# Altium footprint library Horizontal Shielded Modular Jack.PcbLib: 23 footprints (part 1 of 2)
Each footprint in its own frame and in the unit in brackets; x right, y up, seen from the top. Pads: shape width x height; smd on the part's side, far side on the other; paste and mask are expansions set on the pad; w line width, h text height; cw(c..) or ccw(c..) is an arc to the next point about the centre after c.
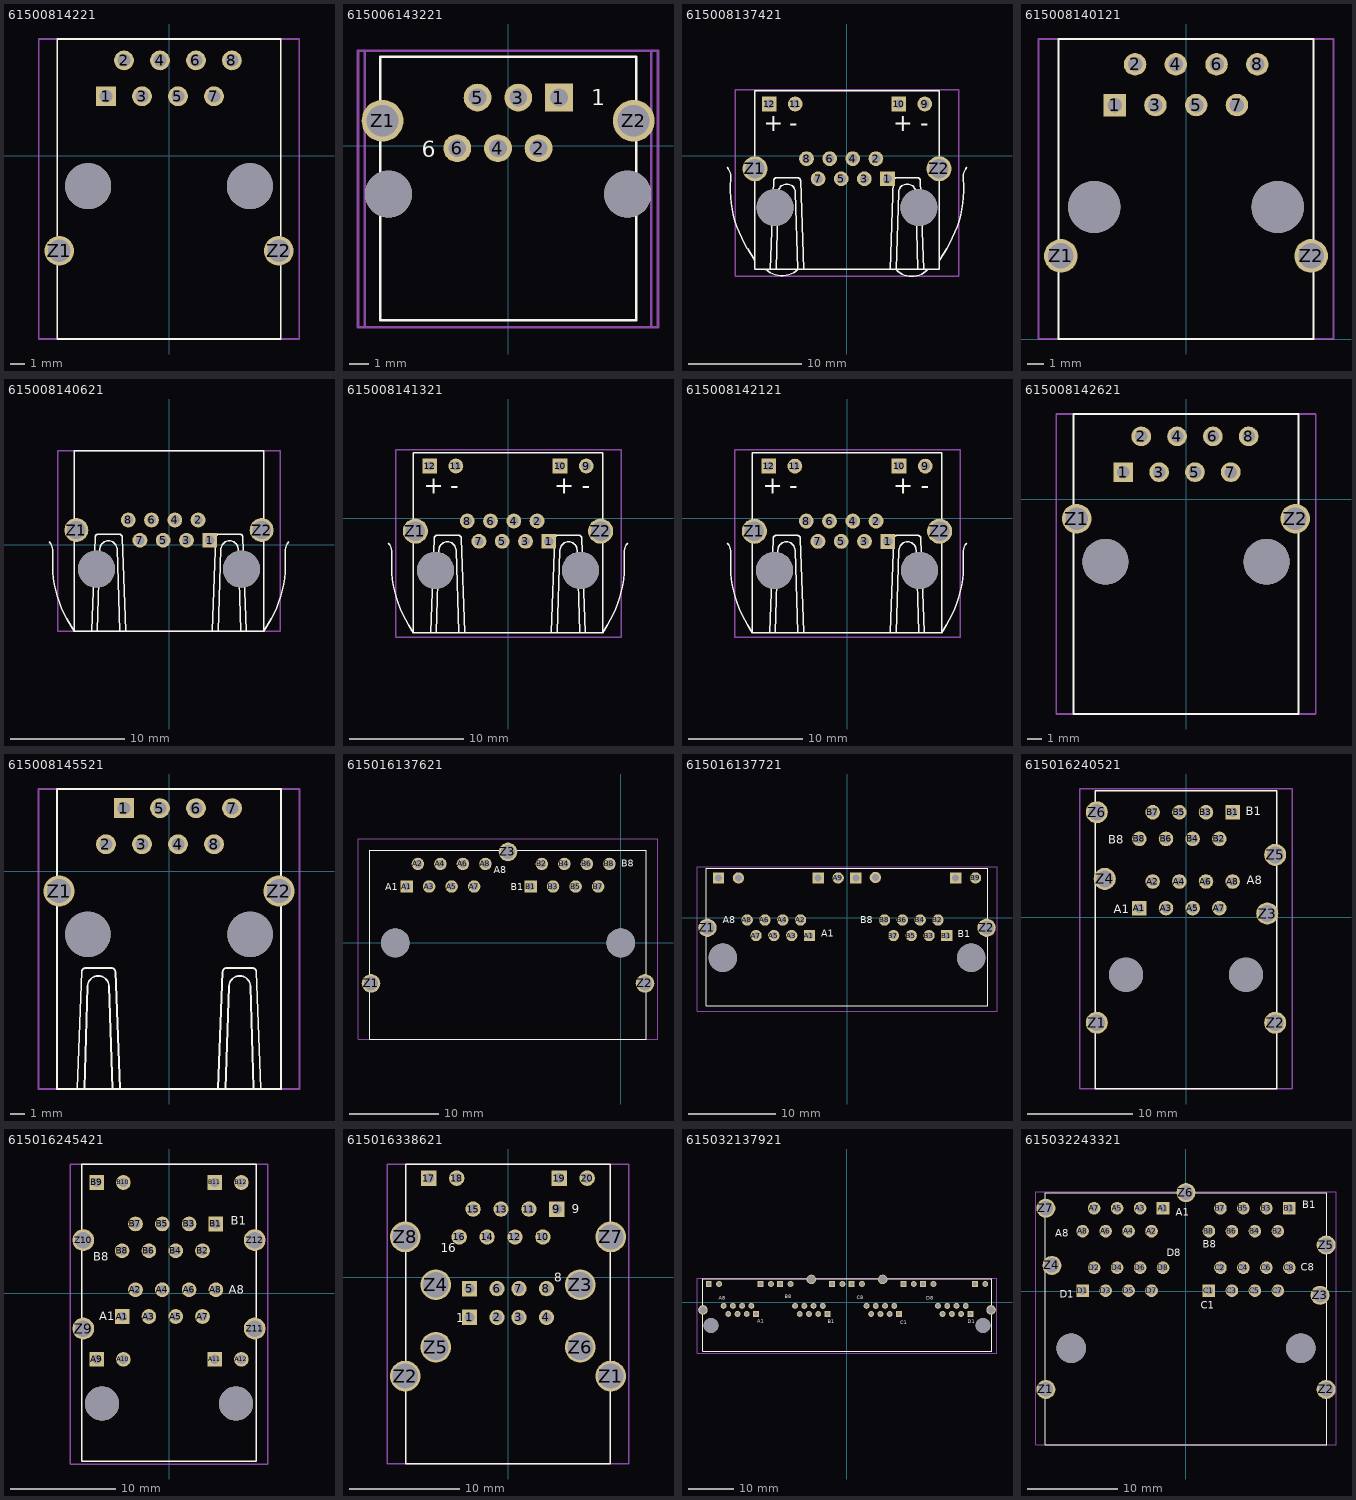
[diagram p0: the footprints below, top view; thin cyan lines are the x and y axes]

## 61500814221 [mm] "RJ45 Horizontal  Shielded  Tab down"
height 13.65
pads (12):
  rect 1.4x1.4 hole 0.9: 1(-4.445,4.19)
  round 1.4 hole 0.9: 2(-3.175,6.73) 3(-1.905,4.19) 4(-0.635,6.73) 5(0.635,4.19) 6(1.905,6.73) 7(3.175,4.19) 8(4.445,6.73)
  round 2.1 hole 1.6: Z1(-7.75,-6.73) Z2(7.75,-6.73)
  round 3.25 hole 3.25 unplated: ""(-5.715,-2.16) ""(5.715,-2.16)
Top Overlay:
  lines w0.127: -7.9,-12.96 -7.9,8.24 7.9,8.24 7.9,-12.96 -7.9,-12.96
Mechanical 15:
  lines w0.127: -9.2,-12.96 -9.2,8.24 9.2,8.24 9.2,-12.96 -9.2,-12.96
3D body: height 13.65, standoff -3.95, extent -7.9,-12.959 7.9,8.241

## 615006143221 [mm] "Horizontal Shielded 1x1 TH    6P6C Tab Up"
height 14.75
pads (10):
  rect 1.4x1.4 hole 0.9: 1(2.55,2.42)
  round 1.4 hole 0.9: 2(1.53,-0.12) 3(0.51,2.42) 4(-0.51,-0.12) 5(-1.53,2.42) 6(-2.55,-0.12)
  round 2.1 hole 1.6: Z1(-6.3,1.26) Z2(6.3,1.26)
  round 2.36 hole 2.36 unplated: ""(-6,-2.42) ""(6,-2.42)
Top Overlay:
  lines w0.127: -6.425,-8.74 6.425,-8.74 6.425,4.48 -6.425,4.48 -6.425,-8.74
  text "6" at -4.325,-0.575 h0.8
  text "1" at 4.175,2.025 h0.8
Mechanical 13:
  lines w0.127: -7.18,-9.09 7.178,-9.09 7.178,4.76 -7.18,4.76 -7.18,-9.09
Mechanical 15:
  lines w0.127: -7.53,-9.09 -7.53,4.76 7.52,4.76 7.52,-9.09 -7.53,-9.09
3D body: height 14.76, standoff -3.39, extent -7.18,-9.09 7.178,4.76

## 615008137421 [mm] "RJ45 Horizontal  Shielded  With LED With EMI panel ground Tab up - Left yellow - Right green"
height 13.25
pads (16):
  rect 1.3x1.3 hole 0.8: 1(3.57,-2.03) 10(4.57,4.57) 12(-6.86,4.57)
  round 1.3 hole 0.8: 2(2.55,-0.25) 3(1.53,-2.03) 4(0.51,-0.25) 5(-0.51,-2.03) 6(-1.53,-0.25) 7(-2.55,-2.03) 8(-3.57,-0.25) 9(6.86,4.57) 11(-4.57,4.57)
  round 2.2 hole 1.7: Z1(-8.125,-1.14) Z2(8.125,-1.14)
  round 3.25 hole 3.25 unplated: ""(-6.35,-4.57) ""(6.35,-4.57)
Top Overlay:
  lines w0.127: -10.575,-1 cw(c-11.746,-1.923) -10.261,-2.048 ccw(c-0.389,-2.929) -8.793,-8.182 ; -8.768,-8.222 -8.133,-9.227 ; -7.148,-10.028 ccw(c-5.734,-8.482) -4.325,-10.032 -4.555,-3.221 ccw(c-5.308,-3.244) -6.06,-3.221 -6.259,-10.03 ; -6.78,-10.03 -6.48,-2.207 cw(c-6.189,-2.218) -6.2,-1.927 -4.38,-1.927 cw(c-4.392,-2.218) -4.101,-2.207 -3.801,-10.03 ; 3.8,-10.03 4.1,-2.206 cw(c4.391,-2.217) 4.38,-1.926 6.199,-1.926 cw(c6.188,-2.217) 6.479,-2.206 6.78,-10.03 ; 6.258,-10.029 6.059,-3.22 ccw(c5.307,-3.243) 4.555,-3.22 4.324,-10.028 ccw(c5.72,-8.755) 7.112,-10.032 ; 8.181,-9.151 8.793,-8.182 ccw(c0.388,-2.929) 10.261,-2.048 cw(c11.746,-1.923) 10.575,-1 ; -8.125,-10.03 -8.125,5.72 8.125,5.72 8.125,-10.03 -8.125,-10.03
  text "+" at -7.366,2.162 h1.52
  text "+" at 4.064,2.162 h1.52
  text "-" at -5.08,2.162 h1.52
  text "-" at 6.477,2.162 h1.52
Mechanical 15:
  lines w0.127: -9.88,-10.61 9.875,-10.61 9.875,5.84 -9.88,5.84 -9.88,-10.61
3D body: height 15.23, standoff -3.21, extent -9.875,-10.43 9.875,6.02

## 615008140121 [mm] "Horizontal Shielded 1x1 TH   3,05mm 8P8C Tab Down"
height 11.85
pads (12):
  rect 1.4x1.4 hole 0.9: 1(-4.445,14.58)
  round 1.4 hole 0.9: 2(-3.175,17.12) 3(-1.905,14.58) 4(-0.635,17.12) 5(0.635,14.58) 6(1.905,17.12) 7(3.175,14.58) 8(4.445,17.12)
  round 2.1 hole 1.6: Z1(-7.8,5.18) Z2(7.8,5.18)
  round 3.25 hole 3.25 unplated: ""(-5.715,8.23) ""(5.715,8.23)
Top Overlay:
  lines w0.127: -7.945,0 7.945,0 7.945,18.7 -7.945,18.7 -7.945,0
Mechanical 15:
  lines w0.127: -9.2,0 9.2,0 9.2,18.7 -9.2,18.7 -9.2,0
3D body: height 11.86, standoff -3.84, extent -7.945,0 7.915,18.7

## 615008140621 [mm] "Horizontal Shielded 1x1 TH  EMI  fingers  8P8C Tab Up"
height 13.25
pads (12):
  rect 1.3x1.3 hole 0.8: 1(3.57,0.38)
  round 1.3 hole 0.8: 2(2.55,2.16) 3(1.53,0.38) 4(0.51,2.16) 5(-0.51,0.38) 6(-1.53,2.16) 7(-2.55,0.38) 8(-3.57,2.16)
  round 2.1 hole 1.6: Z1(-8.125,1.27) Z2(8.125,1.27)
  round 3.25 hole 3.25 unplated: ""(-6.35,-2.16) ""(6.35,-2.16)
Top Overlay:
  lines w0.127: -10.489,0.226 cw(c-11.66,-0.696) -10.174,-0.822 ccw(c-0.302,-1.703) -8.707,-6.956 -8.288,-7.62 ; -6.795,-7.573 -6.48,0.634 cw(c-6.189,0.622) -6.2,0.913 -4.38,0.913 cw(c-4.392,0.622) -4.101,0.633 -3.786,-7.573 ; -6.27,-7.573 -6.06,-0.381 cw(c-5.308,-0.404) -4.556,-0.381 -4.311,-7.608 ; 3.786,-7.573 4.101,0.634 cw(c4.392,0.622) 4.381,0.913 6.2,0.913 cw(c6.189,0.622) 6.48,0.633 6.795,-7.573 ; 4.311,-7.608 4.555,-0.381 cw(c5.308,-0.404) 6.06,-0.381 6.27,-7.573 ; 10.489,0.226 ccw(c11.66,-0.696) 10.174,-0.822 cw(c0.302,-1.703) 8.707,-6.956 8.288,-7.62 ; -8.288,-7.62 -8.288,8.205 8.288,8.205 8.288,-7.62 ; -8.288,-7.62 8.288,-7.62 ; -8.288,-7.62 8.288,-7.62
Mechanical 15:
  lines w0.127: -9.75,-7.62 -9.75,8.205 9.75,8.205 9.75,-7.62 -9.75,-7.62
3D body: height 14.76, standoff -3.48, extent -9.75,-7.62 9.75,8.23

## 615008141321 [mm] "Horizontal Shielded 1x1 TH LED 2x Bipolar Green/Yellow Green=Fw EMI  fingers  8P8C Tab Up"
height 13.25
pads (16):
  rect 1.3x1.3 hole 0.8: 1(3.57,-2.03) 10(4.57,4.57) 12(-6.86,4.57)
  round 1.3 hole 0.8: 2(2.55,-0.25) 3(1.53,-2.03) 4(0.51,-0.25) 5(-0.51,-2.03) 6(-1.53,-0.25) 7(-2.55,-2.03) 8(-3.57,-0.25) 9(6.86,4.57) 11(-4.57,4.57)
  round 2.2 hole 1.7: Z1(-8.125,-1.14) Z2(8.125,-1.14)
  round 3.25 hole 3.25 unplated: ""(-6.35,-4.57) ""(6.35,-4.57)
Top Overlay:
  lines w0.127: -10.489,-2.184 cw(c-11.66,-3.106) -10.174,-3.232 ccw(c-0.302,-4.113) -8.707,-9.366 -8.288,-10.03 ; -6.795,-9.983 -6.48,-1.777 cw(c-6.189,-1.788) -6.2,-1.497 -4.38,-1.497 cw(c-4.392,-1.788) -4.101,-1.777 -3.786,-9.983 ; -6.27,-9.983 -6.06,-2.791 cw(c-5.308,-2.814) -4.556,-2.791 -4.311,-10.019 ; 3.786,-9.983 4.101,-1.777 cw(c4.392,-1.788) 4.381,-1.497 6.2,-1.497 cw(c6.189,-1.788) 6.48,-1.777 6.795,-9.983 ; 4.311,-10.019 4.555,-2.791 cw(c5.308,-2.814) 6.06,-2.791 6.27,-9.983 ; 8.682,-9.405 8.288,-10.03 ; 8.707,-9.366 ccw(c0.302,-4.113) 10.174,-3.232 cw(c11.66,-3.106) 10.489,-2.184 ; -8.288,-10.03 8.288,-10.03 ; -8.288,-10.03 -8.288,5.72 8.288,5.72 8.288,-10.03 ; -8.288,-10.03 8.288,-10.03
  text "-" at 6.477,2.162 h1.52
  text "-" at -5.08,2.162 h1.52
  text "+" at 4.064,2.162 h1.52
  text "+" at -7.366,2.162 h1.52
Mechanical 15:
  lines w0.127: -9.835,-10.45 -9.835,5.99 9.915,5.99 9.915,-10.45 -9.835,-10.45
3D body: height 15, standoff -3.44, extent -9.835,-10.45 9.915,6

## 615008142121 [mm] "Horizontal Shielded 1x1 TH LED 2x Bipolar Yellow/Green Yellow=Fw EMI  fingers  8P8C Tab Up"
height 13.25
pads (16):
  rect 1.3x1.3 hole 0.8: 1(3.57,-2.03) 10(4.57,4.57) 12(-6.86,4.57)
  round 1.3 hole 0.8: 2(2.55,-0.25) 3(1.53,-2.03) 4(0.51,-0.25) 5(-0.51,-2.03) 6(-1.53,-0.25) 7(-2.55,-2.03) 8(-3.57,-0.25) 9(6.86,4.57) 11(-4.57,4.57)
  round 2.2 hole 1.7: Z1(-8.125,-1.14) Z2(8.125,-1.14)
  round 3.25 hole 3.25 unplated: ""(-6.35,-4.57) ""(6.35,-4.57)
Top Overlay:
  lines w0.127: -10.489,-2.184 cw(c-11.66,-3.106) -10.174,-3.232 ccw(c-0.302,-4.113) -8.707,-9.366 -8.288,-10.03 ; -6.795,-9.983 -6.48,-1.777 cw(c-6.189,-1.788) -6.2,-1.497 -4.38,-1.497 cw(c-4.392,-1.788) -4.101,-1.777 -3.786,-9.983 ; -6.27,-9.983 -6.06,-2.791 cw(c-5.308,-2.814) -4.556,-2.791 -4.311,-10.019 ; 3.786,-9.983 4.101,-1.777 cw(c4.392,-1.788) 4.381,-1.497 6.2,-1.497 cw(c6.189,-1.788) 6.48,-1.777 6.795,-9.983 ; 4.311,-10.019 4.555,-2.791 cw(c5.308,-2.814) 6.06,-2.791 6.27,-9.983 ; 10.489,-2.184 ccw(c11.66,-3.106) 10.174,-3.232 cw(c0.302,-4.113) 8.707,-9.366 8.288,-10.03 ; -8.288,-10.03 -8.288,5.72 8.288,5.72 8.288,-10.03 ; -8.288,-10.03 8.288,-10.03
  text "-" at 6.477,2.162 h1.52
  text "-" at -5.08,2.162 h1.52
  text "+" at 4.064,2.162 h1.52
  text "+" at -7.366,2.162 h1.52
Mechanical 15:
  lines w0.127: -9.835,-10.45 -9.835,6 9.915,6 9.915,-10.45 -9.835,-10.45
3D body: height 15, standoff -3.44, extent -9.835,-10.45 9.915,6

## 615008142621 [mm] "Horizontal Shielded 1x1 TH   rear EMI PCB post 8P8C Tab Down"
height 13.3
pads (12):
  rect 1.4x1.4 hole 0.9: 1(-4.445,1.905)
  round 1.4 hole 0.9: 2(-3.175,4.445) 3(-1.905,1.905) 4(-0.635,4.445) 5(0.635,1.905) 6(1.905,4.445) 7(3.175,1.905) 8(4.445,4.445)
  round 2.1 hole 1.6: Z1(-7.75,-1.395) Z2(7.75,-1.395)
  round 3.25 hole 3.25 unplated: ""(-5.715,-4.445) ""(5.715,-4.445)
Top Overlay:
  lines w0.127: -7.978,-15.245 -7.978,6.03 7.977,6.03 7.977,-15.245 -7.978,-15.245
Mechanical 15:
  lines w0.127: -9.2,-15.245 -9.2,6.03 9.2,6.03 9.2,-15.245 -9.2,-15.245
3D body: height 13.66, standoff -3.68, extent -7.94,-15.245 7.94,5.955

## 615008145521 [mm] "Cat 5e - Horizontal Shielded - 1x1 - TH -  EMI  fingers  - 8P8C - Tab Down"
height 13.6
pads (12):
  rect 1.4x1.4 hole 0.9: 1(-3.175,4.445)
  round 1.4 hole 0.9: 2(-4.445,1.905) 3(-1.905,1.905) 4(0.635,1.905) 5(-0.635,4.445) 6(1.905,4.445) 7(4.445,4.445) 8(3.175,1.905)
  round 2.2 hole 1.7: Z1(-7.75,-1.395) Z2(7.75,-1.395)
  round 3.2 hole 3.2 unplated: ""(-5.715,-4.445) ""(5.715,-4.445)
Top Overlay:
  lines w0.127: -6.47,-15.298 -6.155,-7.091 cw(c-5.864,-7.103) -5.875,-6.812 ; -5.945,-15.298 -5.735,-8.106 cw(c-4.983,-8.129) -4.231,-8.106 -3.986,-15.333 ; -5.875,-6.812 -4.056,-6.812 ; -4.056,-6.812 cw(c-4.067,-7.103) -3.776,-7.092 -3.461,-15.298 ; 3.461,-15.298 3.775,-7.091 cw(c4.067,-7.103) 4.055,-6.812 ; 3.986,-15.333 4.23,-8.106 cw(c4.983,-8.129) 5.735,-8.106 5.945,-15.298 ; 4.055,-6.812 5.875,-6.812 ; 5.875,-6.812 cw(c5.864,-7.103) 6.155,-7.092 6.47,-15.298 ; -7.9,-15.345 7.9,-15.345 7.9,5.795 -7.9,5.795 -7.9,-15.345
Mechanical 13:
  text "7" at 5.195,4.56 h0.8
  text "6" at 2.655,4.56 h0.8
  text "5" at 0.115,4.56 h0.8
  text "4" at 1.385,2.02 h0.8
  text "3" at -1.155,2.02 h0.8
  text "2" at -3.695,2.02 h0.8
  text "8" at 3.925,2.02 h0.8
  text "1" at -2.25,4.5 h0.8
Mechanical 15:
  lines w0.127: -9.2,-15.345 9.2,-15.345 9.2,5.795 -9.2,5.795 -9.2,-15.345
3D body: height 16.45, standoff -2.7, extent -7.9,-15.345 7.9,5.795

## 615016137621 [mm] "RJ45 Horizontal Dual port Shielded Tab down"
height 13.5
pads (21):
  rect 1.4x1.4 hole 0.9: A1(-24.13,6.35) B1(-10.16,6.35)
  round 1.4 hole 0.9: A2(-22.86,8.89) A3(-21.59,6.35) A4(-20.32,8.89) A5(-19.05,6.35) A6(-17.78,8.89) A7(-16.51,6.35) A8(-15.24,8.89) B2(-8.89,8.89) B3(-7.62,6.35) B4(-6.35,8.89) B5(-5.08,6.35) B6(-3.81,8.89) B7(-2.54,6.35) B8(-1.27,8.89)
  round 2.1 hole 1.6: Z1(-28.135,-4.57) Z2(2.735,-4.57) Z3(-12.7,10.24)
  round 3.25 hole 3.25 unplated: ""(-25.4,0) ""(0,0)
Top Overlay:
  lines w0.127: -28.26,-10.85 -28.26,10.42 2.86,10.42 2.86,-10.85 -28.26,-10.85
  text "B8" at 0.075,8.55 h0.8
  text "B1" at -12.375,5.95 h0.8
  text "A8" at -14.325,7.85 h0.8
  text "A1" at -26.55,5.9 h0.8
Mechanical 15:
  lines w0.127: -29.6,-10.85 -29.6,11.72 4.2,11.72 4.2,-10.85 -29.6,-10.85
3D body: height 13.55, standoff -3.6, extent -28.259,-10.85 2.871,10.42

## 615016137721 [mm] "RJ45 Horizontal Dual port Shielded  With LED With EMI panel ground Tab up - left yellow - right green"
height 13.2
pads (28):
  rect 1.3x1.3 hole 0.8: A1(-4.305,-2.056) A10(-3.305,4.544) A12(-14.735,4.544) B1(11.445,-2.056) B10(12.445,4.544) B12(1.015,4.544)
  round 1.3 hole 0.8: A2(-5.325,-0.276) A3(-6.345,-2.056) A4(-7.365,-0.276) A5(-8.385,-2.056) A6(-9.405,-0.276) A7(-10.425,-2.056) A8(-11.445,-0.276) A9(-1.015,4.544) A11(-12.445,4.544) B2(10.425,-0.276) B3(9.405,-2.056) B4(8.385,-0.276) B5(7.365,-2.056) B6(6.345,-0.276) B7(5.325,-2.056) B8(4.305,-0.276) B9(14.735,4.544) B11(3.251,4.596)
  round 2.1 hole 1.6: Z1(-16,-1.166) Z2(16,-1.166)
  round 3.25 hole 3.25 unplated: ""(-14.225,-4.596) ""(14.225,-4.596)
Top Overlay:
  lines w0.127: -16.125,-10.096 16.125,-10.096 16.125,5.654 -16.125,5.654 -16.125,-10.096
  text "A1" at -2.925,-2.2 h0.8
  text "A8" at -14.225,-0.675 h0.8
  text "B1" at 12.675,-2.275 h0.8
  text "B8" at 1.525,-0.675 h0.8
Mechanical 15:
  lines w0.127: -17.192,-10.75 17.192,-10.75 17.192,5.84 -17.192,5.84 -17.192,-10.75
3D body: height 14.52, standoff -3.5, extent -17.187,-10.71 17.187,5.84

## 615016240521 [mm] "Horizontal Shielded 2x1 TH  EMI  fingers  8P8C Tab Down & Up"
height 25.2
pads (24):
  rect 1.39x1.39 hole 0.89: A1(-4.445,0.89) B1(4.445,10.03)
  round 1.39 hole 0.89: A2(-3.175,3.43) A3(-1.905,0.89) A4(-0.635,3.43) A5(0.635,0.89) A6(1.905,3.43) A7(3.175,0.89) A8(4.445,3.43) B2(3.175,7.49) B3(1.905,10.03) B4(0.635,7.49) B5(-0.635,10.03) B6(-1.905,7.49) B7(-3.175,10.03) B8(-4.445,7.49)
  round 2.1 hole 1.6: Z1(-8.505,-10.03) Z2(8.505,-10.03) Z3(7.745,0.38) Z4(-7.745,3.68) Z5(8.505,5.97) Z6(-8.505,10.03)
  round 3.25 hole 3.25 unplated: ""(-5.715,-5.46) ""(5.715,-5.46)
Top Overlay:
  lines w0.127: -8.635,-16.35 8.635,-16.35 8.635,12.1 -8.635,12.1 -8.635,-16.35
  text "A1" at -6.875,0.425 h0.8
  text "A8" at 5.8,3.15 h0.8
  text "B1" at 5.675,9.75 h0.8
  text "B8" at -7.4,7.025 h0.8
Mechanical 15:
  lines w0.127: -10.136,-16.35 10.136,-16.35 10.136,12.25 -10.136,12.25 -10.136,-16.35
3D body: height 25.21, standoff -4.14, extent -10.136,-16.275 10.136,12.175

## 615016245421 [mm] "Horizontal Shielded 2x1 TH  EMI  fingers with LED (Yellow=left / Green=right) 8P8C Tab Down & Up"
height 25.4
pads (30):
  rect 1.39x1.39 hole 0.89: A1(-4.445,-2.225) A9(-6.86,-6.285) A11(4.32,-6.285) B1(4.445,6.545) B9(-6.86,10.475) B11(4.32,10.475)
  round 1.39 hole 0.89: A2(-3.175,0.315) A3(-1.905,-2.225) A4(-0.635,0.315) A5(0.635,-2.225) A6(1.905,0.315) A7(3.175,-2.225) A8(4.445,0.315) A10(-4.32,-6.285) A12(6.86,-6.285) B2(3.175,4.005) B3(1.905,6.545) B4(0.635,4.005) B5(-0.635,6.545) B6(-1.905,4.005) B7(-3.175,6.545) B8(-4.445,4.005) B10(-4.32,10.475) B12(6.86,10.475)
  round 2.07 hole 1.57: Z9(-8.12,-3.365) Z10(-8.12,5.015) Z11(8.12,-3.365) Z12(8.12,5.015)
  round 3.25 hole 3.25 unplated: ""(-6.345,-10.475) ""(6.345,-10.475)
Top Overlay:
  lines w0.127: -8.25,-15.935 8.25,-15.935 8.25,12.215 -8.25,12.215 -8.25,-15.935
  text "A1" at -6.6,-2.575 h0.8
  text "A8" at 5.675,-0.05 h0.8
  text "B8" at -7.2,3.075 h0.8
  text "B1" at 5.85,6.475 h0.8
Mechanical 15:
  lines w0.127: -9.362,-16.2 9.362,-16.2 9.362,12.228 -9.362,12.228 -9.362,-16.2
3D body: height 26.38, standoff -3.6, extent -9.362,-16.2 9.362,12.228

## 615016338621 [mm] "RJ45 + dual USB stacked Horizontal Tab up"
height 31.6
pads (28):
  rect 1.4x1.4 hole 0.9: 1(-3.5,-3.665) 5(-3.5,-1.045) 9(4.445,6.195) 17(-7.205,9.005) 19(4.665,9.005)
  round 1.4 hole 0.9: 2(-1,-3.665) 3(1,-3.665) 4(3.5,-3.665) 6(-1,-1.045) 7(1,-1.045) 8(3.5,-1.045) 10(3.175,3.655) 11(1.905,6.195) 12(0.635,3.655) 13(-0.635,6.195) 14(-1.905,3.655) 15(-3.175,6.195) 16(-4.445,3.655) 18(-4.665,9.005) 20(7.205,9.005)
  round 2.8 hole 2.3: Z1(9.35,-9.005) Z2(-9.35,-9.005) Z3(6.57,-0.695) Z4(-6.57,-0.695) Z5(-6.57,-6.375) Z6(6.57,-6.375) Z7(9.35,3.655) Z8(-9.35,3.655)
Top Overlay:
  lines w0.127: -9.3,-17.005 -9.3,10.295 9.3,10.295 9.3,-17.005 -9.3,-17.005
  text "16" at -6.1,2.247 h0.8
  text "9" at 5.79,5.835 h0.8
  text "8" at 4.187,-0.42 h0.8
  text "1" at -4.703,-4.103 h0.8
Mechanical 15:
  lines w0.127: -11,-17.005 11,-17.005 11,10.295 -11,10.295 -11,-17.005
3D body: height 31.6, standoff -3.2, extent -9.4,-17.005 9.4,10.295

## 615032137921 [mm] "RJ45 Horizontal Ganged 4 ports Shielded  With LED With EMI panel ground Tab up - left yellow - right green"
height 13.25
pads (54):
  rect 1.3x1.3 hole 0.8: A1(-20.055,-2.54) A10(-19.055,4.06) A12(-30.485,4.06) B1(-4.305,-2.54) B10(-3.305,4.06) B12(-14.735,4.06) C1(11.445,-2.54) C10(12.445,4.06) C12(1.015,4.06) D1(27.195,-2.54) D10(28.195,4.06) D12(16.765,4.06)
  round 1.3 hole 0.8: A2(-21.075,-0.76) A3(-22.095,-2.54) A4(-23.115,-0.76) A5(-24.135,-2.54) A6(-25.155,-0.76) A7(-26.175,-2.54) A8(-27.195,-0.76) A9(-16.765,4.06) A11(-28.195,4.06) B2(-5.325,-0.76) B3(-6.345,-2.54) B4(-7.365,-0.76) B5(-8.385,-2.54) B6(-9.405,-0.76) B7(-10.425,-2.54) B8(-11.445,-0.76) B9(-1.015,4.06) B11(-12.445,4.06) C2(10.425,-0.76) C3(9.405,-2.54) C4(8.385,-0.76) C5(7.365,-2.54) C6(6.345,-0.76) C7(5.325,-2.54) C8(4.305,-0.76) C9(14.735,4.06) C11(3.305,4.06) D2(26.175,-0.76) D3(25.155,-2.54) D4(24.135,-0.76) D5(23.115,-2.54) D6(22.095,-0.76) D7(21.075,-2.54) D8(20.055,-0.76) D9(30.485,4.06) D11(19.055,4.06)
  round 2.1 hole 1.6: Z17(-31.75,-1.65) Z18(-7.875,5.08) Z19(7.875,5.08) Z20(31.75,-1.65)
  round 3.25 hole 3.25 unplated: ""(-29.975,-5.08) ""(29.975,-5.08)
Top Overlay:
  lines w0.127: -31.78,-10.718 31.875,-10.718 31.875,5.21 -31.78,5.21 -31.78,-10.718
  text "A1" at -19.803,-4.502 h0.8
  text "B1" at -4.26,-4.59 h0.8
  text "B8" at -13.731,0.954 h0.8
  text "A8" at -28.295,0.536 h0.8
  text "C1" at 11.756,-4.766 h0.8
  text "C8" at 2.197,0.745 h0.8
  text "D1" at 26.584,-4.623 h0.8
  text "D8" at 17.443,0.591 h0.8
Mechanical 15:
  lines w0.127: -33.065,-11.24 33.065,-11.24 33.065,5.35 -33.065,5.35 -33.065,-11.24
3D body: height 14.66, standoff -3.46, extent -33.065,-11.24 33.065,5.35

## 615032243321 [mm] "Horizontal Shielded 2x2 TH  EMI  fingers  8P8C Tab Down & Up"
height 25.29
pads (41):
  rect 1.39x1.39 hole 0.89: A1(-2.54,9.155) B1(11.43,9.155) C1(2.54,0.035) D1(-11.43,0.035)
  round 1.39 hole 0.89: A2(-3.81,6.615) A3(-5.08,9.155) A4(-6.35,6.615) A5(-7.62,9.155) A6(-8.89,6.615) A7(-10.16,9.155) A8(-11.43,6.615) B2(10.16,6.615) B3(8.89,9.155) B4(7.62,6.615) B5(6.35,9.155) B6(5.08,6.615) B7(3.81,9.155) B8(2.54,6.615) C2(3.81,2.575) C3(5.08,0.035) C4(6.35,2.575) C5(7.62,0.035) C6(8.89,2.575) C7(10.16,0.035) C8(11.43,2.575) D2(-10.16,2.575) D3(-8.89,0.035) D4(-7.62,2.575) D5(-6.35,0.035) D6(-5.08,2.575) D7(-3.81,0.035) D8(-2.54,2.575)
  round 2.1 hole 1.6: Z1(-15.495,-10.885) Z2(15.495,-10.885) Z3(14.82,-0.475) Z4(-14.82,2.825) Z5(15.495,5.085) Z6(0,10.885) Z7(-15.495,9.155)
  round 3.25 hole 3.25 unplated: ""(-12.7,-6.315) ""(12.7,-6.315)
Top Overlay:
  lines w0.127: -15.584,-17.015 -15.584,10.885 15.586,10.885 15.586,-17.015 -15.584,-17.015
  text "C1" at 1.647,-1.983 h0.8
  text "C8" at 12.68,2.23 h0.8
  text "B1" at 12.878,9.171 h0.8
  text "B8" at 1.878,4.76 h0.8
  text "A8" at -14.479,5.981 h0.8
  text "A1" at -1.158,8.302 h0.8
  text "D8" at -2.137,3.847 h0.8
  text "D1" at -13.962,-0.762 h0.8
Mechanical 15:
  lines w0.127: -16.584,-17.015 -16.584,10.985 16.586,10.985 16.586,-17.015 -16.584,-17.015
3D body: height 26.01, standoff -3.84, extent -16.584,-17.015 16.586,10.985